# Altium footprint library ref-packages.PCBLIB: 1543 footprints (part 46 of 103) (continued)
## QFP100_SOT382-1 [mm]
pads (100):
  rect 0.4x1.4 smd: 1(-9.425,-8.125) 2(-8.775,-8.125) 3(-8.125,-8.125) 4(-7.475,-8.125) 5(-6.825,-8.125) 6(-6.175,-8.125) 7(-5.525,-8.125) 8(-4.875,-8.125) 9(-4.225,-8.125) 10(-3.575,-8.125) 11(-2.925,-8.125) 12(-2.275,-8.125) 13(-1.625,-8.125) 14(-0.975,-8.125) 15(-0.325,-8.125) 16(0.325,-8.125) 17(0.975,-8.125) 18(1.625,-8.125) 19(2.275,-8.125) 20(2.925,-8.125) 21(3.575,-8.125) 22(4.225,-8.125) 23(4.875,-8.125) 24(5.525,-8.125) 25(6.175,-8.125) 26(6.825,-8.125) 27(7.475,-8.125) 28(8.125,-8.125) 29(8.775,-8.125) 30(9.425,-8.125) 51(9.425,8.125) 52(8.775,8.125) 53(8.125,8.125) 54(7.475,8.125) 55(6.825,8.125) 56(6.175,8.125) 57(5.525,8.125) 58(4.875,8.125) 59(4.225,8.125) 60(3.575,8.125) 61(2.925,8.125) 62(2.275,8.125) 63(1.625,8.125) 64(0.975,8.125) 65(0.325,8.125) 66(-0.325,8.125) 67(-0.975,8.125) 68(-1.625,8.125) 69(-2.275,8.125) 70(-2.925,8.125) 71(-3.575,8.125) 72(-4.225,8.125) 73(-4.875,8.125) 74(-5.525,8.125) 75(-6.175,8.125) 76(-6.825,8.125) 77(-7.475,8.125) 78(-8.125,8.125) 79(-8.775,8.125) 80(-9.425,8.125)
  rect 1.4x0.4 smd: 31(11.125,-6.175) 32(11.125,-5.525) 33(11.125,-4.875) 34(11.125,-4.225) 35(11.125,-3.575) 36(11.125,-2.925) 37(11.125,-2.275) 38(11.125,-1.625) 39(11.125,-0.975) 40(11.125,-0.325) 41(11.125,0.325) 42(11.125,0.975) 43(11.125,1.625) 44(11.125,2.275) 45(11.125,2.925) 46(11.125,3.575) 47(11.125,4.225) 48(11.125,4.875) 49(11.125,5.525) 50(11.125,6.175) 81(-11.125,6.175) 82(-11.125,5.525) 83(-11.125,4.875) 84(-11.125,4.225) 85(-11.125,3.575) 86(-11.125,2.925) 87(-11.125,2.275) 88(-11.125,1.625) 89(-11.125,0.975) 90(-11.125,0.325) 91(-11.125,-0.325) 92(-11.125,-0.975) 93(-11.125,-1.625) 94(-11.125,-2.275) 95(-11.125,-2.925) 96(-11.125,-3.575) 97(-11.125,-4.225) 98(-11.125,-4.875) 99(-11.125,-5.525) 100(-11.125,-6.175)
Top Overlay:
  lines w0.203: -9.625,-6.625 9.625,-6.625 9.625,6.625 -9.625,6.625 -9.625,-6.625
Mechanical 16:
  rectangle: -9.575,-8.275 -9.275,-6.675
  rectangle: -8.925,-8.275 -8.625,-6.675
  rectangle: -8.275,-8.275 -7.975,-6.675
  rectangle: -7.625,-8.275 -7.325,-6.675
  rectangle: -6.975,-8.275 -6.675,-6.675
  rectangle: -6.325,-8.275 -6.025,-6.675
  rectangle: -5.675,-8.275 -5.375,-6.675
  rectangle: -5.025,-8.275 -4.725,-6.675
  rectangle: -4.375,-8.275 -4.075,-6.675
  rectangle: -3.725,-8.275 -3.425,-6.675
  rectangle: -3.075,-8.275 -2.775,-6.675
  rectangle: -2.425,-8.275 -2.125,-6.675
  rectangle: -1.775,-8.275 -1.475,-6.675
  rectangle: -1.125,-8.275 -0.825,-6.675
  rectangle: -0.475,-8.275 -0.175,-6.675
  rectangle: 0.175,-8.275 0.475,-6.675
  rectangle: 0.825,-8.275 1.125,-6.675
  rectangle: 1.475,-8.275 1.775,-6.675
  rectangle: 2.125,-8.275 2.425,-6.675
  rectangle: 2.775,-8.275 3.075,-6.675
  rectangle: 3.425,-8.275 3.725,-6.675
  rectangle: 4.075,-8.275 4.375,-6.675
  rectangle: 4.725,-8.275 5.025,-6.675
  rectangle: 5.375,-8.275 5.675,-6.675
  rectangle: 6.025,-8.275 6.325,-6.675
  rectangle: 6.675,-8.275 6.975,-6.675
  rectangle: 7.325,-8.275 7.625,-6.675
  rectangle: 7.975,-8.275 8.275,-6.675
  rectangle: 8.625,-8.275 8.925,-6.675
  rectangle: 9.275,-8.275 9.575,-6.675
  rectangle: 9.725,-6.325 11.325,-6.025
  rectangle: 9.725,-5.675 11.325,-5.375
  rectangle: 9.725,-5.025 11.325,-4.725
  rectangle: 9.725,-4.375 11.325,-4.075
  rectangle: 9.725,-3.725 11.325,-3.425
  rectangle: 9.725,-3.075 11.325,-2.775
  rectangle: 9.725,-2.425 11.325,-2.125
  rectangle: 9.725,-1.775 11.325,-1.475
  rectangle: 9.725,-1.125 11.325,-0.825
  rectangle: 9.725,-0.475 11.325,-0.175
  rectangle: 9.725,0.175 11.325,0.475
  rectangle: 9.725,0.825 11.325,1.125
  rectangle: 9.725,1.475 11.325,1.775
  rectangle: 9.725,2.125 11.325,2.425
  rectangle: 9.725,2.775 11.325,3.075
  rectangle: 9.725,3.425 11.325,3.725
  rectangle: 9.725,4.075 11.325,4.375
  rectangle: 9.725,4.725 11.325,5.025
  rectangle: 9.725,5.375 11.325,5.675
  rectangle: 9.725,6.025 11.325,6.325
  rectangle: 9.275,6.675 9.575,8.275
  rectangle: 8.625,6.675 8.925,8.275
  rectangle: 7.975,6.675 8.275,8.275
  rectangle: 7.325,6.675 7.625,8.275
  rectangle: 6.675,6.675 6.975,8.275
  rectangle: 6.025,6.675 6.325,8.275
  rectangle: 5.375,6.675 5.675,8.275
  rectangle: 4.725,6.675 5.025,8.275
  rectangle: 4.075,6.675 4.375,8.275
  rectangle: 3.425,6.675 3.725,8.275
  rectangle: 2.775,6.675 3.075,8.275
  rectangle: 2.125,6.675 2.425,8.275
  rectangle: 1.475,6.675 1.775,8.275
  rectangle: 0.825,6.675 1.125,8.275
  rectangle: 0.175,6.675 0.475,8.275
  rectangle: -0.475,6.675 -0.175,8.275
  rectangle: -1.125,6.675 -0.825,8.275
  rectangle: -1.775,6.675 -1.475,8.275
  rectangle: -2.425,6.675 -2.125,8.275
  rectangle: -3.075,6.675 -2.775,8.275
  rectangle: -3.725,6.675 -3.425,8.275
  rectangle: -4.375,6.675 -4.075,8.275
  rectangle: -5.025,6.675 -4.725,8.275
  rectangle: -5.675,6.675 -5.375,8.275
  rectangle: -6.325,6.675 -6.025,8.275
  rectangle: -6.975,6.675 -6.675,8.275
  rectangle: -7.625,6.675 -7.325,8.275
  rectangle: -8.275,6.675 -7.975,8.275
  rectangle: -8.925,6.675 -8.625,8.275
  rectangle: -9.575,6.675 -9.275,8.275
  rectangle: -11.325,6.025 -9.725,6.325
  rectangle: -11.325,5.375 -9.725,5.675
  rectangle: -11.325,4.725 -9.725,5.025
  rectangle: -11.325,4.075 -9.725,4.375
  rectangle: -11.325,3.425 -9.725,3.725
  rectangle: -11.325,2.775 -9.725,3.075
  rectangle: -11.325,2.125 -9.725,2.425
  rectangle: -11.325,1.475 -9.725,1.775
  rectangle: -11.325,0.825 -9.725,1.125
  rectangle: -11.325,0.175 -9.725,0.475
  rectangle: -11.325,-0.475 -9.725,-0.175
  rectangle: -11.325,-1.125 -9.725,-0.825
  rectangle: -11.325,-1.775 -9.725,-1.475
  rectangle: -11.325,-2.425 -9.725,-2.125
  rectangle: -11.325,-3.075 -9.725,-2.775
  rectangle: -11.325,-3.725 -9.725,-3.425
  rectangle: -11.325,-4.375 -9.725,-4.075
  rectangle: -11.325,-5.025 -9.725,-4.725
  rectangle: -11.325,-5.675 -9.725,-5.375
  rectangle: -11.325,-6.325 -9.725,-6.025

## QFP100R [mm]
pads (100):
  rect 0.4x1.8 smd: 1(-9.425,-8.1) 2(-8.775,-8.1) 3(-8.125,-8.1) 4(-7.475,-8.1) 5(-6.825,-8.1) 6(-6.175,-8.1) 7(-5.525,-8.1) 8(-4.875,-8.1) 9(-4.225,-8.1) 10(-3.575,-8.1) 11(-2.925,-8.1) 12(-2.275,-8.1) 13(-1.625,-8.1) 14(-0.975,-8.1) 15(-0.325,-8.1) 16(0.325,-8.1) 17(0.975,-8.1) 18(1.625,-8.1) 19(2.275,-8.1) 20(2.925,-8.1) 21(3.575,-8.1) 22(4.225,-8.1) 23(4.875,-8.1) 24(5.525,-8.1) 25(6.175,-8.1) 26(6.825,-8.1) 27(7.475,-8.1) 28(8.125,-8.1) 29(8.775,-8.1) 30(9.425,-8.1) 51(9.425,8.1) 52(8.775,8.1) 53(8.125,8.1) 54(7.475,8.1) 55(6.825,8.1) 56(6.175,8.1) 57(5.525,8.1) 58(4.875,8.1) 59(4.225,8.1) 60(3.575,8.1) 61(2.925,8.1) 62(2.275,8.1) 63(1.625,8.1) 64(0.975,8.1) 65(0.325,8.1) 66(-0.325,8.1) 67(-0.975,8.1) 68(-1.625,8.1) 69(-2.275,8.1) 70(-2.925,8.1) 71(-3.575,8.1) 72(-4.225,8.1) 73(-4.875,8.1) 74(-5.525,8.1) 75(-6.175,8.1) 76(-6.825,8.1) 77(-7.475,8.1) 78(-8.125,8.1) 79(-8.775,8.1) 80(-9.425,8.1)
  rect 1.8x0.4 smd: 31(11.1,-6.175) 32(11.1,-5.525) 33(11.1,-4.875) 34(11.1,-4.225) 35(11.1,-3.575) 36(11.1,-2.925) 37(11.1,-2.275) 38(11.1,-1.625) 39(11.1,-0.975) 40(11.1,-0.325) 41(11.1,0.325) 42(11.1,0.975) 43(11.1,1.625) 44(11.1,2.275) 45(11.1,2.925) 46(11.1,3.575) 47(11.1,4.225) 48(11.1,4.875) 49(11.1,5.525) 50(11.1,6.175) 81(-11.1,6.175) 82(-11.1,5.525) 83(-11.1,4.875) 84(-11.1,4.225) 85(-11.1,3.575) 86(-11.1,2.925) 87(-11.1,2.275) 88(-11.1,1.625) 89(-11.1,0.975) 90(-11.1,0.325) 91(-11.1,-0.325) 92(-11.1,-0.975) 93(-11.1,-1.625) 94(-11.1,-2.275) 95(-11.1,-2.925) 96(-11.1,-3.575) 97(-11.1,-4.225) 98(-11.1,-4.875) 99(-11.1,-5.525) 100(-11.1,-6.175)
Top Overlay:
  circle w0.254: c-8.65,-5.5 r0.75
  lines w0.203: -9.57,-6.56 9.56,-6.56 9.56,6.56 -9.57,6.56 -9.57,-6.56
Mechanical 16:
  rectangle: -9.615,-8.72 -9.235,-6.95
  rectangle: 9.95,-6.365 11.72,-5.985
  rectangle: -8.965,-8.72 -8.585,-6.95
  rectangle: -8.315,-8.72 -7.935,-6.95
  rectangle: -7.665,-8.72 -7.285,-6.95
  rectangle: -7.015,-8.72 -6.635,-6.95
  rectangle: -6.365,-8.72 -5.985,-6.95
  rectangle: -5.715,-8.72 -5.335,-6.95
  rectangle: -5.065,-8.72 -4.685,-6.95
  rectangle: -4.415,-8.72 -4.035,-6.95
  rectangle: -3.765,-8.72 -3.385,-6.95
  rectangle: -3.115,-8.72 -2.735,-6.95
  rectangle: -2.465,-8.72 -2.085,-6.95
  rectangle: -1.815,-8.72 -1.435,-6.95
  rectangle: -1.165,-8.72 -0.785,-6.95
  rectangle: -0.515,-8.72 -0.135,-6.95
  rectangle: 0.135,-8.72 0.515,-6.95
  rectangle: 0.785,-8.72 1.165,-6.95
  rectangle: 1.435,-8.72 1.815,-6.95
  rectangle: 2.085,-8.72 2.465,-6.95
  rectangle: 2.735,-8.72 3.115,-6.95
  rectangle: 3.385,-8.72 3.765,-6.95
  rectangle: 4.035,-8.72 4.415,-6.95
  rectangle: 4.685,-8.72 5.065,-6.95
  rectangle: 5.335,-8.72 5.715,-6.95
  rectangle: 5.985,-8.72 6.365,-6.95
  rectangle: 6.635,-8.72 7.015,-6.95
  rectangle: 7.285,-8.72 7.665,-6.95
  rectangle: 7.935,-8.72 8.315,-6.95
  rectangle: 8.585,-8.72 8.965,-6.95
  rectangle: 9.235,-8.72 9.615,-6.95
  rectangle: 9.95,-5.715 11.72,-5.335
  rectangle: 9.95,-5.065 11.72,-4.685
  rectangle: 9.95,-4.415 11.72,-4.035
  rectangle: 9.95,-3.765 11.72,-3.385
  rectangle: 9.95,-3.115 11.72,-2.735
  rectangle: 9.95,-2.465 11.72,-2.085
  rectangle: 9.95,-1.815 11.72,-1.435
  rectangle: 9.95,-1.165 11.72,-0.785
  rectangle: 9.95,-0.515 11.72,-0.135
  rectangle: 9.95,0.135 11.72,0.515
  rectangle: 9.95,0.785 11.72,1.165
  rectangle: 9.95,1.435 11.72,1.815
  rectangle: 9.95,2.085 11.72,2.465
  rectangle: 9.95,2.735 11.72,3.115
  rectangle: 9.95,3.385 11.72,3.765
  rectangle: 9.95,4.035 11.72,4.415
  rectangle: 9.95,4.685 11.72,5.065
  rectangle: 9.95,5.335 11.72,5.715
  rectangle: 9.95,5.985 11.72,6.365
  rectangle: 9.235,6.95 9.615,8.72
  rectangle: 8.585,6.95 8.965,8.72
  rectangle: 7.935,6.95 8.315,8.72
  rectangle: 7.285,6.95 7.665,8.72
  rectangle: 6.635,6.95 7.015,8.72
  rectangle: 5.985,6.95 6.365,8.72
  rectangle: 5.335,6.95 5.715,8.72
  rectangle: 4.685,6.95 5.065,8.72
  rectangle: 4.035,6.95 4.415,8.72
  rectangle: 3.385,6.95 3.765,8.72
  rectangle: 2.735,6.95 3.115,8.72
  rectangle: 2.085,6.95 2.465,8.72
  rectangle: 1.435,6.95 1.815,8.72
  rectangle: 0.785,6.95 1.165,8.72
  rectangle: 0.135,6.95 0.515,8.72
  rectangle: -0.515,6.95 -0.135,8.72
  rectangle: -1.165,6.95 -0.785,8.72
  rectangle: -1.815,6.95 -1.435,8.72
  rectangle: -2.465,6.95 -2.085,8.72
  rectangle: -3.115,6.95 -2.735,8.72
  rectangle: -3.765,6.95 -3.385,8.72
  rectangle: -4.415,6.95 -4.035,8.72
  rectangle: -5.065,6.95 -4.685,8.72
  rectangle: -5.715,6.95 -5.335,8.72
  rectangle: -6.365,6.95 -5.985,8.72
  rectangle: -7.015,6.95 -6.635,8.72
  rectangle: -7.665,6.95 -7.285,8.72
  rectangle: -8.315,6.95 -7.935,8.72
  rectangle: -8.965,6.95 -8.585,8.72
  rectangle: -9.615,6.95 -9.235,8.72
  rectangle: -11.72,5.985 -9.95,6.365
  rectangle: -11.72,5.335 -9.95,5.715
  rectangle: -11.72,4.685 -9.95,5.065
  rectangle: -11.72,4.035 -9.95,4.415
  rectangle: -11.72,3.385 -9.95,3.765
  rectangle: -11.72,2.735 -9.95,3.115
  rectangle: -11.72,2.085 -9.95,2.465
  rectangle: -11.72,1.435 -9.95,1.815
  rectangle: -11.72,0.785 -9.95,1.165
  rectangle: -11.72,0.135 -9.95,0.515
  rectangle: -11.72,-0.515 -9.95,-0.135
  rectangle: -11.72,-1.165 -9.95,-0.785
  rectangle: -11.72,-1.815 -9.95,-1.435
  rectangle: -11.72,-2.465 -9.95,-2.085
  rectangle: -11.72,-3.115 -9.95,-2.735
  rectangle: -11.72,-3.765 -9.95,-3.385
  rectangle: -11.72,-4.415 -9.95,-4.035
  rectangle: -11.72,-5.065 -9.95,-4.685
  rectangle: -11.72,-5.715 -9.95,-5.335
  rectangle: -11.72,-6.365 -9.95,-5.985
  lines w0.203: -9.9,-6.9 9.9,-6.9 9.9,6.9 -9.9,6.9 -9.9,-6.9

## QFP120_SOT349-2 [mm]
pads (120):
  rect 0.6x1.5 smd: 1(-11.6,-16.2) 30(11.6,-16.2) 61(11.6,16.2) 90(-11.6,16.2)
  rect 0.5x1.5 smd: 2(-10.8,-16.2) 3(-10,-16.2) 4(-9.2,-16.2) 5(-8.4,-16.2) 6(-7.6,-16.2) 7(-6.8,-16.2) 8(-6,-16.2) 9(-5.2,-16.2) 10(-4.4,-16.2) 11(-3.6,-16.2) 12(-2.8,-16.2) 13(-2,-16.2) 14(-1.2,-16.2) 15(-0.4,-16.2) 16(0.4,-16.2) 17(1.2,-16.2) 18(2,-16.2) 19(2.8,-16.2) 20(3.6,-16.2) 21(4.4,-16.2) 22(5.2,-16.2) 23(6,-16.2) 24(6.8,-16.2) 25(7.6,-16.2) 26(8.4,-16.2) 27(9.2,-16.2) 28(10,-16.2) 29(10.8,-16.2) 62(10.8,16.2) 63(10,16.2) 64(9.2,16.2) 65(8.4,16.2) 66(7.6,16.2) 67(6.8,16.2) 68(6,16.2) 69(5.2,16.2) 70(4.4,16.2) 71(3.6,16.2) 72(2.8,16.2) 73(2,16.2) 74(1.2,16.2) 75(0.4,16.2) 76(-0.4,16.2) 77(-1.2,16.2) 78(-2,16.2) 79(-2.8,16.2) 80(-3.6,16.2) 81(-4.4,16.2) 82(-5.2,16.2) 83(-6,16.2) 84(-6.8,16.2) 85(-7.6,16.2) 86(-8.4,16.2) 87(-9.2,16.2) 88(-10,16.2) 89(-10.8,16.2)
  rect 1.5x0.6 smd: 31(16.2,-11.6) 60(16.2,11.6) 91(-16.2,11.6) 120(-16.2,-11.6)
  rect 1.5x0.5 smd: 32(16.2,-10.8) 33(16.2,-10) 34(16.2,-9.2) 35(16.2,-8.4) 36(16.2,-7.6) 37(16.2,-6.8) 38(16.2,-6) 39(16.2,-5.2) 40(16.2,-4.4) 41(16.2,-3.6) 42(16.2,-2.8) 43(16.2,-2) 44(16.2,-1.2) 45(16.2,-0.4) 46(16.2,0.4) 47(16.2,1.2) 48(16.2,2) 49(16.2,2.8) 50(16.2,3.6) 51(16.2,4.4) 52(16.2,5.2) 53(16.2,6) 54(16.2,6.8) 55(16.2,7.6) 56(16.2,8.4) 57(16.2,9.2) 58(16.2,10) 59(16.2,10.8) 92(-16.2,10.8) 93(-16.2,10) 94(-16.2,9.2) 95(-16.2,8.4) 96(-16.2,7.6) 97(-16.2,6.8) 98(-16.2,6) 99(-16.2,5.2) 100(-16.2,4.4) 101(-16.2,3.6) 102(-16.2,2.8) 103(-16.2,2) 104(-16.2,1.2) 105(-16.2,0.4) 106(-16.2,-0.4) 107(-16.2,-1.2) 108(-16.2,-2) 109(-16.2,-2.8) 110(-16.2,-3.6) 111(-16.2,-4.4) 112(-16.2,-5.2) 113(-16.2,-6) 114(-16.2,-6.8) 115(-16.2,-7.6) 116(-16.2,-8.4) 117(-16.2,-9.2) 118(-16.2,-10) 119(-16.2,-10.8)
Top Overlay:
  circle w0.203: c-11.8,-11.8 r0.6
  lines w0.203: -14.1,-14.1 14.1,-14.1 14.1,14.1 -14.1,14.1 -14.1,-14.1
Mechanical 16:
  rectangle: -11.8,-16.55 -11.4,-14.2
  rectangle: -11,-16.55 -10.6,-14.2
  rectangle: -10.2,-16.55 -9.8,-14.2
  rectangle: -9.4,-16.55 -9,-14.2
  rectangle: -8.6,-16.55 -8.2,-14.2
  rectangle: -7.8,-16.55 -7.4,-14.2
  rectangle: -7,-16.55 -6.6,-14.2
  rectangle: -6.2,-16.55 -5.8,-14.2
  rectangle: -5.4,-16.55 -5,-14.2
  rectangle: -4.6,-16.55 -4.2,-14.2
  rectangle: -3.8,-16.55 -3.4,-14.2
  rectangle: -3,-16.55 -2.6,-14.2
  rectangle: -2.2,-16.55 -1.8,-14.2
  rectangle: -1.4,-16.55 -1,-14.2
  rectangle: -0.6,-16.55 -0.2,-14.2
  rectangle: 0.2,-16.55 0.6,-14.2
  rectangle: 1,-16.55 1.4,-14.2
  rectangle: 1.8,-16.55 2.2,-14.2
  rectangle: 2.6,-16.55 3,-14.2
  rectangle: 3.4,-16.55 3.8,-14.2
  rectangle: 4.2,-16.55 4.6,-14.2
  rectangle: 5,-16.55 5.4,-14.2
  rectangle: 5.8,-16.55 6.2,-14.2
  rectangle: 6.6,-16.55 7,-14.2
  rectangle: 7.4,-16.55 7.8,-14.2
  rectangle: 8.2,-16.55 8.6,-14.2
  rectangle: 9,-16.55 9.4,-14.2
  rectangle: 9.8,-16.55 10.2,-14.2
  rectangle: 10.6,-16.55 11,-14.2
  rectangle: 11.4,-16.55 11.8,-14.2
  rectangle: 14.2,-11.8 16.55,-11.4
  rectangle: 14.2,-11 16.55,-10.6
  rectangle: 14.2,-10.2 16.55,-9.8
  rectangle: 14.2,-9.4 16.55,-9
  rectangle: 14.2,-8.6 16.55,-8.2
  rectangle: 14.2,-7.8 16.55,-7.4
  rectangle: 14.2,-7 16.55,-6.6
  rectangle: 14.2,-6.2 16.55,-5.8
  rectangle: 14.2,-5.4 16.55,-5
  rectangle: 14.2,-4.6 16.55,-4.2
  rectangle: 14.2,-3.8 16.55,-3.4
  rectangle: 14.2,-3 16.55,-2.6
  rectangle: 14.2,-2.2 16.55,-1.8
  rectangle: 14.2,-1.4 16.55,-1
  rectangle: 14.2,-0.6 16.55,-0.2
  rectangle: 14.2,0.2 16.55,0.6
  rectangle: 14.2,1 16.55,1.4
  rectangle: 14.2,1.8 16.55,2.2
  rectangle: 14.2,2.6 16.55,3
  rectangle: 14.2,3.4 16.55,3.8
  rectangle: 14.2,4.2 16.55,4.6
  rectangle: 14.2,5 16.55,5.4
  rectangle: 14.2,5.8 16.55,6.2
  rectangle: 14.2,6.6 16.55,7
  rectangle: 14.2,7.4 16.55,7.8
  rectangle: 14.2,8.2 16.55,8.6
  rectangle: 14.2,9 16.55,9.4
  rectangle: 14.2,9.8 16.55,10.2
  rectangle: 14.2,10.6 16.55,11
  rectangle: 14.2,11.4 16.55,11.8
  rectangle: 11.4,14.2 11.8,16.55
  rectangle: 10.6,14.2 11,16.55
  rectangle: 9.8,14.2 10.2,16.55
  rectangle: 9,14.2 9.4,16.55
  rectangle: 8.2,14.2 8.6,16.55
  rectangle: 7.4,14.2 7.8,16.55
  rectangle: 6.6,14.2 7,16.55
  rectangle: 5.8,14.2 6.2,16.55
  rectangle: 5,14.2 5.4,16.55
  rectangle: 4.2,14.2 4.6,16.55
  rectangle: 3.4,14.2 3.8,16.55
  rectangle: 2.6,14.2 3,16.55
  rectangle: 1.8,14.2 2.2,16.55
  rectangle: 1,14.2 1.4,16.55
  rectangle: 0.2,14.2 0.6,16.55
  rectangle: -0.6,14.2 -0.2,16.55
  rectangle: -1.4,14.2 -1,16.55
  rectangle: -2.2,14.2 -1.8,16.55
  rectangle: -3,14.2 -2.6,16.55
  rectangle: -3.8,14.2 -3.4,16.55
  rectangle: -4.6,14.2 -4.2,16.55
  rectangle: -5.4,14.2 -5,16.55
  rectangle: -6.2,14.2 -5.8,16.55
  rectangle: -7,14.2 -6.6,16.55
  rectangle: -7.8,14.2 -7.4,16.55
  rectangle: -8.6,14.2 -8.2,16.55
  rectangle: -9.4,14.2 -9,16.55
  rectangle: -10.2,14.2 -9.8,16.55
  rectangle: -11,14.2 -10.6,16.55
  rectangle: -11.8,14.2 -11.4,16.55
  rectangle: -16.55,11.4 -14.2,11.8
  rectangle: -16.55,10.6 -14.2,11
  rectangle: -16.55,9.8 -14.2,10.2
  rectangle: -16.55,9 -14.2,9.4
  rectangle: -16.55,8.2 -14.2,8.6
  rectangle: -16.55,7.4 -14.2,7.8
  rectangle: -16.55,6.6 -14.2,7
  rectangle: -16.55,5.8 -14.2,6.2
  rectangle: -16.55,5 -14.2,5.4
  rectangle: -16.55,4.2 -14.2,4.6
  rectangle: -16.55,3.4 -14.2,3.8
  rectangle: -16.55,2.6 -14.2,3
  rectangle: -16.55,1.8 -14.2,2.2
  rectangle: -16.55,1 -14.2,1.4
  rectangle: -16.55,0.2 -14.2,0.6
  rectangle: -16.55,-0.6 -14.2,-0.2
  rectangle: -16.55,-1.4 -14.2,-1
  rectangle: -16.55,-2.2 -14.2,-1.8
  rectangle: -16.55,-3 -14.2,-2.6
  rectangle: -16.55,-3.8 -14.2,-3.4
  rectangle: -16.55,-4.6 -14.2,-4.2
  rectangle: -16.55,-5.4 -14.2,-5
  rectangle: -16.55,-6.2 -14.2,-5.8
  rectangle: -16.55,-7 -14.2,-6.6
  rectangle: -16.55,-7.8 -14.2,-7.4
  rectangle: -16.55,-8.6 -14.2,-8.2
  rectangle: -16.55,-9.4 -14.2,-9
  rectangle: -16.55,-10.2 -14.2,-9.8
  rectangle: -16.55,-11 -14.2,-10.6
  rectangle: -16.55,-11.8 -14.2,-11.4

## QFP128_SOT320-2 [mm]
pads (128):
  rect 0.6x1.5 smd: 1(-12.4,-15.1) 32(12.4,-15.1) 65(12.4,15.1) 96(-12.4,15.1)
  rect 0.5x1.5 smd: 2(-11.6,-15.1) 3(-10.8,-15.1) 4(-10,-15.1) 5(-9.2,-15.1) 6(-8.4,-15.1) 7(-7.6,-15.1) 8(-6.8,-15.1) 9(-6,-15.1) 10(-5.2,-15.1) 11(-4.4,-15.1) 12(-3.6,-15.1) 13(-2.8,-15.1) 14(-2,-15.1) 15(-1.2,-15.1) 16(-0.4,-15.1) 17(0.4,-15.1) 18(1.2,-15.1) 19(2,-15.1) 20(2.8,-15.1) 21(3.6,-15.1) 22(4.4,-15.1) 23(5.2,-15.1) 24(6,-15.1) 25(6.8,-15.1) 26(7.6,-15.1) 27(8.4,-15.1) 28(9.2,-15.1) 29(10,-15.1) 30(10.8,-15.1) 31(11.6,-15.1) 66(11.6,15.1) 67(10.8,15.1) 68(10,15.1) 69(9.2,15.1) 70(8.4,15.1) 71(7.6,15.1) 72(6.8,15.1) 73(6,15.1) 74(5.2,15.1) 75(4.4,15.1) 76(3.6,15.1) 77(2.8,15.1) 78(2,15.1) 79(1.2,15.1) 80(0.4,15.1) 81(-0.4,15.1) 82(-1.2,15.1) 83(-2,15.1) 84(-2.8,15.1) 85(-3.6,15.1) 86(-4.4,15.1) 87(-5.2,15.1) 88(-6,15.1) 89(-6.8,15.1) 90(-7.6,15.1) 91(-8.4,15.1) 92(-9.2,15.1) 93(-10,15.1) 94(-10.8,15.1) 95(-11.6,15.1)
  rect 1.5x0.6 smd: 33(15.1,-12.4) 64(15.1,12.4) 97(-15.1,12.4) 128(-15.1,-12.4)
  rect 1.5x0.5 smd: 34(15.1,-11.6) 35(15.1,-10.8) 36(15.1,-10) 37(15.1,-9.2) 38(15.1,-8.4) 39(15.1,-7.6) 40(15.1,-6.8) 41(15.1,-6) 42(15.1,-5.2) 43(15.1,-4.4) 44(15.1,-3.6) 45(15.1,-2.8) 46(15.1,-2) 47(15.1,-1.2) 48(15.1,-0.4) 49(15.1,0.4) 50(15.1,1.2) 51(15.1,2) 52(15.1,2.8) 53(15.1,3.6) 54(15.1,4.4) 55(15.1,5.2) 56(15.1,6) 57(15.1,6.8) 58(15.1,7.6) 59(15.1,8.4) 60(15.1,9.2) 61(15.1,10) 62(15.1,10.8) 63(15.1,11.6) 98(-15.1,11.6) 99(-15.1,10.8) 100(-15.1,10) 101(-15.1,9.2) 102(-15.1,8.4) 103(-15.1,7.6) 104(-15.1,6.8) 105(-15.1,6) 106(-15.1,5.2) 107(-15.1,4.4) 108(-15.1,3.6) 109(-15.1,2.8) 110(-15.1,2) 111(-15.1,1.2) 112(-15.1,0.4) 113(-15.1,-0.4) 114(-15.1,-1.2) 115(-15.1,-2) 116(-15.1,-2.8) 117(-15.1,-3.6) 118(-15.1,-4.4) 119(-15.1,-5.2) 120(-15.1,-6) 121(-15.1,-6.8) 122(-15.1,-7.6) 123(-15.1,-8.4) 124(-15.1,-9.2) 125(-15.1,-10) 126(-15.1,-10.8) 127(-15.1,-11.6)
Top Overlay:
  circle w0.203: c-12.4,-12.4 r0.51
  lines w0.203: -14.2,-14.2 14.2,-14.2 14.2,14.2 -14.2,14.2 -14.2,-14.2
Mechanical 16:
  rectangle: -12.6,-15.45 -12.2,-14.25
  rectangle: -11.8,-15.45 -11.4,-14.25
  rectangle: -11,-15.45 -10.6,-14.25
  rectangle: -10.2,-15.45 -9.8,-14.25
  rectangle: -9.4,-15.45 -9,-14.25
  rectangle: -8.6,-15.45 -8.2,-14.25
  rectangle: -7.8,-15.45 -7.4,-14.25
  rectangle: -7,-15.45 -6.6,-14.25
  rectangle: -6.2,-15.45 -5.8,-14.25
  rectangle: -5.4,-15.45 -5,-14.25
  rectangle: -4.6,-15.45 -4.2,-14.25
  rectangle: -3.8,-15.45 -3.4,-14.25
  rectangle: -3,-15.45 -2.6,-14.25
  rectangle: -2.2,-15.45 -1.8,-14.25
  rectangle: -1.4,-15.45 -1,-14.25
  rectangle: -0.6,-15.45 -0.2,-14.25
  rectangle: 0.2,-15.45 0.6,-14.25
  rectangle: 1,-15.45 1.4,-14.25
  rectangle: 1.8,-15.45 2.2,-14.25
  rectangle: 2.6,-15.45 3,-14.25
  rectangle: 3.4,-15.45 3.8,-14.25
  rectangle: 4.2,-15.45 4.6,-14.25
  rectangle: 5,-15.45 5.4,-14.25
  rectangle: 5.8,-15.45 6.2,-14.25
  rectangle: 6.6,-15.45 7,-14.25
  rectangle: 7.4,-15.45 7.8,-14.25
  rectangle: 8.2,-15.45 8.6,-14.25
  rectangle: 9,-15.45 9.4,-14.25
  rectangle: 9.8,-15.45 10.2,-14.25
  rectangle: 10.6,-15.45 11,-14.25
  rectangle: 11.4,-15.45 11.8,-14.25
  rectangle: 12.2,-15.45 12.6,-14.25
  rectangle: 14.25,-12.6 15.45,-12.2
  rectangle: 14.25,-11.8 15.45,-11.4
  rectangle: 14.25,-11 15.45,-10.6
  rectangle: 14.25,-10.2 15.45,-9.8
  rectangle: 14.25,-9.4 15.45,-9
  rectangle: 14.25,-8.6 15.45,-8.2
  rectangle: 14.25,-7.8 15.45,-7.4
  rectangle: 14.25,-7 15.45,-6.6
  rectangle: 14.25,-6.2 15.45,-5.8
  rectangle: 14.25,-5.4 15.45,-5
  rectangle: 14.25,-4.6 15.45,-4.2
  rectangle: 14.25,-3.8 15.45,-3.4
  rectangle: 14.25,-3 15.45,-2.6
  rectangle: 14.25,-2.2 15.45,-1.8
  rectangle: 14.25,-1.4 15.45,-1
  rectangle: 14.25,-0.6 15.45,-0.2
  rectangle: 14.25,0.2 15.45,0.6
  rectangle: 14.25,1 15.45,1.4
  rectangle: 14.25,1.8 15.45,2.2
  rectangle: 14.25,2.6 15.45,3
  rectangle: 14.25,3.4 15.45,3.8
  rectangle: 14.25,4.2 15.45,4.6
  rectangle: 14.25,5 15.45,5.4
  rectangle: 14.25,5.8 15.45,6.2
  rectangle: 14.25,6.6 15.45,7
  rectangle: 14.25,7.4 15.45,7.8
  rectangle: 14.25,8.2 15.45,8.6
  rectangle: 14.25,9 15.45,9.4
  rectangle: 14.25,9.8 15.45,10.2
  rectangle: 14.25,10.6 15.45,11
  rectangle: 14.25,11.4 15.45,11.8
  rectangle: 14.25,12.2 15.45,12.6
  rectangle: 12.2,14.25 12.6,15.45
  rectangle: 11.4,14.25 11.8,15.45
  rectangle: 10.6,14.25 11,15.45
  rectangle: 9.8,14.25 10.2,15.45
  rectangle: 9,14.25 9.4,15.45
  rectangle: 8.2,14.25 8.6,15.45
  rectangle: 7.4,14.25 7.8,15.45
  rectangle: 6.6,14.25 7,15.45
  rectangle: 5.8,14.25 6.2,15.45
  rectangle: 5,14.25 5.4,15.45
  rectangle: 4.2,14.25 4.6,15.45
  rectangle: 3.4,14.25 3.8,15.45
  rectangle: 2.6,14.25 3,15.45
  rectangle: 1.8,14.25 2.2,15.45
  rectangle: 1,14.25 1.4,15.45
  rectangle: 0.2,14.25 0.6,15.45
  rectangle: -0.6,14.25 -0.2,15.45
  rectangle: -1.4,14.25 -1,15.45
  rectangle: -2.2,14.25 -1.8,15.45
  rectangle: -3,14.25 -2.6,15.45
  rectangle: -3.8,14.25 -3.4,15.45
  rectangle: -4.6,14.25 -4.2,15.45
  rectangle: -5.4,14.25 -5,15.45
  rectangle: -6.2,14.25 -5.8,15.45
  rectangle: -7,14.25 -6.6,15.45
  rectangle: -7.8,14.25 -7.4,15.45
  rectangle: -8.6,14.25 -8.2,15.45
  rectangle: -9.4,14.25 -9,15.45
  rectangle: -10.2,14.25 -9.8,15.45
  rectangle: -11,14.25 -10.6,15.45
  rectangle: -11.8,14.25 -11.4,15.45
  rectangle: -12.6,14.25 -12.2,15.45
  rectangle: -15.45,12.2 -14.25,12.6
  rectangle: -15.45,11.4 -14.25,11.8
  rectangle: -15.45,10.6 -14.25,11
  rectangle: -15.45,9.8 -14.25,10.2
  rectangle: -15.45,9 -14.25,9.4
  rectangle: -15.45,8.2 -14.25,8.6
  rectangle: -15.45,7.4 -14.25,7.8
  rectangle: -15.45,6.6 -14.25,7
  rectangle: -15.45,5.8 -14.25,6.2
  rectangle: -15.45,5 -14.25,5.4
  rectangle: -15.45,4.2 -14.25,4.6
  rectangle: -15.45,3.4 -14.25,3.8
  rectangle: -15.45,2.6 -14.25,3
  rectangle: -15.45,1.8 -14.25,2.2
  rectangle: -15.45,1 -14.25,1.4
  rectangle: -15.45,0.2 -14.25,0.6
  rectangle: -15.45,-0.6 -14.25,-0.2
  rectangle: -15.45,-1.4 -14.25,-1
  rectangle: -15.45,-2.2 -14.25,-1.8
  rectangle: -15.45,-3 -14.25,-2.6
  rectangle: -15.45,-3.8 -14.25,-3.4
  rectangle: -15.45,-4.6 -14.25,-4.2
  rectangle: -15.45,-5.4 -14.25,-5
  rectangle: -15.45,-6.2 -14.25,-5.8
  rectangle: -15.45,-7 -14.25,-6.6
  rectangle: -15.45,-7.8 -14.25,-7.4
  rectangle: -15.45,-8.6 -14.25,-8.2
  rectangle: -15.45,-9.4 -14.25,-9
  rectangle: -15.45,-10.2 -14.25,-9.8
  rectangle: -15.45,-11 -14.25,-10.6
  rectangle: -15.45,-11.8 -14.25,-11.4
  rectangle: -15.45,-12.6 -14.25,-12.2